# Altium integrated library Diode-SMD_V2.IntLib: 415 symbols (part 2 of 2)
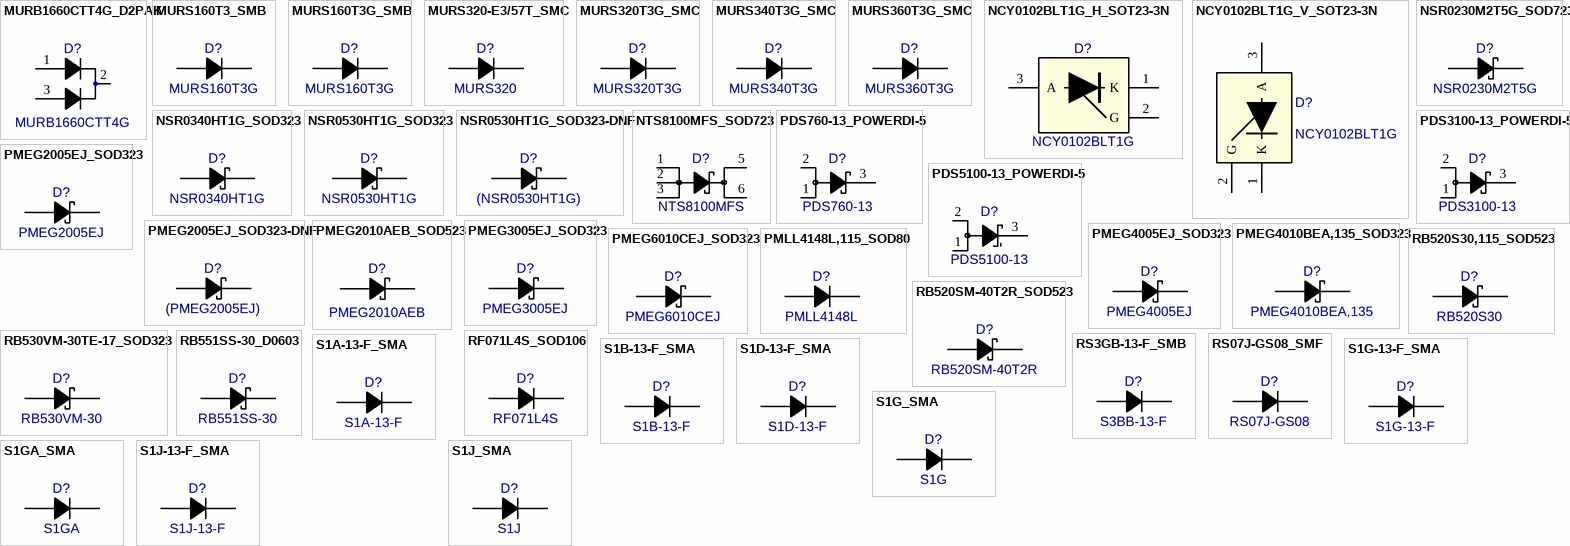
[diagram p11: symbols MURB1660CTT4G_D2PAK to S1J_SMA]

## NSR0530HT1G_SOD323
designator D?, comment NSR0530HT1G
Diode Schottky Barrier (30Volt 0.5A); Manufacturer: On Semi; Package: SOD323; EDM-PN: *; Text2: *; Text1: *; Part Number: NSR0530HT1G; SAAB PN: *; Value: NSR0530HT1G; DCE Part No: *
footprint SOD323 (Diode, SOD323 2-Leads, Body 1.7x1.25mm, IPC Medium Density)
pins: 1 C, 2 A

## NSR0530HT1G_SOD323-DNF
designator D?, comment value (NSR0530HT1G)  (hidden comment: NSR0530HT1G)
Diode Schottky Barrier (30Volt 0.5A) - Do not Fit; Manufacturer: On Semi; Part Number: DNF - NSR0530HT1G; Package: SOD323; EDM-PN: *; Text2: *; Text1: *; SAAB PN: *; DCE Part No: *
footprint SOD323 (Diode, SOD323 2-Leads, Body 1.7x1.25mm, IPC Medium Density)
pins: 1 C, 2 A

## NTS8100MFS_SOD723
designator D?, comment NTS8100MFS
Diode Schottky 100Volt 8A; Manufacturer: On Semi; Package: SO8-FL-5.8x4.9; EDM-PN: *; Text2: *; Text1: *; Part Number: NTS8100MFS; SAAB PN: *; Value: NTS8100MFS; DCE Part No: *
footprint SO8-FL-5.8x4.9 (SO 8 FL 5.8x4.9mm)
pins: 1 A, 2 A, 3 A, 5 C, 6 C

## PDS760-13_POWERDI-5
designator D?, comment PDS760-13
Diode Schottky 60Volt 7A; Manufacturer: Diodes; Package: POWERDI-5; EDM-PN: *; Text2: *; Text1: *; Value: PDS760-13; SAAB PN: *; Part Number: PDS760-13; DCE Part No: *
footprint POWERDI-5 (POWERDI-5 4.0x5.45mm)
pins: 1 A, 2 A, 3 C

## PDS3100-13_POWERDI-5
designator D?, comment PDS3100-13
Diode Schottky 100Volt 3A; Manufacturer: Diodes; Package: POWERDI-5; EDM-PN: *; Text2: *; Text1: *; Value: PDS3100-13; SAAB PN: *; Part Number: PDS3100-13; DCE Part No: *
footprint POWERDI-5 (POWERDI-5 4.0x5.45mm)
pins: 1 A, 2 A, 3 C

## PDS5100-13_POWERDI-5
designator D?, comment PDS5100-13
Diode Schottky 100Volt 5A; Manufacturer: Diodes; Package: POWERDI-5; EDM-PN: *; Text2: *; Text1: *; Value: PDS5100-13; SAAB PN: *; Part Number: PDS5100-13; DCE Part No: *
footprint POWERDI-5 (POWERDI-5 4.0x5.45mm)
pins: 1 A, 2 A, 3 C

## PMEG2005EJ_SOD323
designator D?, comment PMEG2005EJ
Diode Schottky 20Volt 0.5A; Manufacturer: NXP/Digikey; Part Number: PMEG2005EJ/568-4110-1; Package: SOD323; EDM-PN: *; Text2: *; Text1: *; SAAB PN: *; Value: PMEG2005EJ; DCE Part No: *
footprint SOD323 (Diode, SOD323 2-Leads, Body 1.7x1.25mm, IPC Medium Density)
pins: 1 C, 2 A

## PMEG2005EJ_SOD323-DNF
designator D?, comment value (PMEG2005EJ)  (hidden comment: PMEG2005EJ-DNF)
Diode Schottky 20Volt 0.5A Do not Fit; Manufacturer: NXP/Digikey; Part Number: DNF - PMEG2005EJ/568-4110-1; Package: SOD323; EDM-PN: *; Text2: *; Text1: *; SAAB PN: *; DCE Part No: *
footprint SOD323 (Diode, SOD323 2-Leads, Body 1.7x1.25mm, IPC Medium Density)
pins: 1 C, 2 A

## PMEG2010AEB_SOD523
designator D?, comment PMEG2010AEB
Diode Schottky 20V 1A; Manufacturer: Nexperia; Package: SOD523; EDM-PN: *; Text2: *; Text1: *; Value: PMEG2010AEB; SAAB PN: *; Part Number: PMEG2010AEB; DCE Part No: *
footprint SOD523 (SOD523 1.25x0.85mm)
pins: 1 C, 2 A

## PMEG3005EJ_SOD323
designator D?, comment PMEG3005EJ
Diode Schottky 30Volt 0.5A; Manufacturer: NXP; Package: SOD323; EDM-PN: *; Text2: *; Text1: *; Value: PMEG3005EJ; SAAB PN: *; Part Number: PMEG3005EJ; DCE Part No: *
footprint SOD323 (Diode, SOD323 2-Leads, Body 1.7x1.25mm, IPC Medium Density)
pins: 1 C, 2 A

## PMEG4005EJ_SOD323
designator D?, comment PMEG4005EJ
Diode Schottky 40Volt 0.5A; Manufacturer: NXP; Package: SOD323; EDM-PN: *; Text2: *; Text1: *; Value: PMEG4005EJ; SAAB PN: *; Part Number: PMEG4005EJ; DCE Part No: *
footprint SOD323 (Diode, SOD323 2-Leads, Body 1.7x1.25mm, IPC Medium Density)
pins: 1 C, 2 A

## PMEG4010BEA,135_SOD323
designator D?, comment PMEG4010BEA,135
Diode Schottky 40Volt 1A; Manufacturer: Nexperia; Package: SOD323; EDM-PN: *; Text2: *; Text1: *; Value: PMEG4010BEA,135; SAAB PN: *; Part Number: PMEG4010BEA,135; DCE Part No: *
footprint SOD323 (Diode, SOD323 2-Leads, Body 1.7x1.25mm, IPC Medium Density)
pins: 1 C, 2 A

## PMEG6010CEJ_SOD323
designator D?, comment PMEG6010CEJ
Diode Schottky 60Volt 1A; Manufacturer: NXP; Package: SOD323; EDM-PN: *; Text2: *; Text1: *; Value: PMEG6010CEJ; SAAB PN: *; Part Number: PMEG6010CEJ; DCE Part No: *
footprint SOD323 (Diode, SOD323 2-Leads, Body 1.7x1.25mm, IPC Medium Density)
pins: 1 C, 2 A

## PMLL4148L,115_SOD80
designator D?, comment value PMLL4148L  (hidden comment: PMLL4148L,115)
Diode Fast Switching Surface Mount; Manufacturer: Nexperia; Package: SOD80; EDM-PN: *; Text2: *; Text1: *; SAAB PN: *; Part Number: PMLL4148L,115; DCE Part No: *
footprint SOD80 (Diode, SOD80 2-Leads, Body 3.5x1.4mm, IPC Medium Density)
pins: 1 C, 2 A

## RB520S30,115_SOD523
designator D?, comment value RB520S30  (hidden comment: RB520S30,115)
Diode Schottky 30V 200mA; Manufacturer: Nexperia; Package: SOD523; EDM-PN: *; Text2: *; Text1: *; SAAB PN: *; Part Number: RB520S30,115; DCE Part No: *
footprint SOD523 (SOD523 1.25x0.85mm)
pins: 1 C, 2 A

## RB520SM-40T2R_SOD523
designator D?, comment RB520SM-40T2R
Diode Schottky 40V 200mA; Manufacturer: Rohm; Package: SOD523; EDM-PN: *; Text2: *; Text1: *; Value: RB520SM-40T2R; SAAB PN: *; Part Number: RB520SM-40T2R; DCE Part No: *
footprint SOD523 (SOD523 1.25x0.85mm)
pins: 1 C, 2 A

## RB530VM-30TE-17_SOD323
designator D?, comment value RB530VM-30  (hidden comment: RB530VM-30TE-17)
Diode Schottky (30Volt 100mA); Manufacturer: Rohm; Package: SOD323; EDM-PN: *; Text2: *; Text1: *; SAAB PN: *; Part Number: RB530VM-30TE-17; DCE Part No: *
footprint SOD323 (Diode, SOD323 2-Leads, Body 1.7x1.25mm, IPC Medium Density)
pins: 1 C, 2 A

## RB551SS-30_D0603
designator D?, comment RB551SS-30
Diode Schottky (20Volt 0.5A); Manufacturer: Rohm; Package: D0603-KMD2; EDM-PN: *; Text2: *; Text1: *; Value: RB551SS-30; SAAB PN: *; Part Number: RB551SS-30; DCE Part No: *
footprint D0603-KMD2 (KMD2 1.6x0.8mm)
pins: 1 C, 2 A

## RF071L4S_SOD106
designator D?, comment RF071L4S
Diode Super fast Recovery 0.7Amp 400V; Manufacturer: Rohm; Package: SOD106; EDM-PN: *; Text2: *; Text1: *; Value: RF071L4S; SAAB PN: *; Part Number: RF071L4S; DCE Part No: *
footprint SOD106 (SOD 106 4.5x2.6mm)
pins: 1 C, 2 A

## RS3GB-13-F_SMB
designator D?, comment Part Number: S3BB-13-F  (hidden comment: RS3GB-13-F)
Diode Rectifier 400V 3Amp; Manufacturer: Diodes; Package: SMB; EDM-PN: *; Text2: *; Text1: *; Value: RS3GB-13-F; Reutech PN: *; SAAB PN: *; DCE Part No: *
footprint SMB (SMB 4.75x3.94mm)
pins: 1 C, 2 A

## RS07J-GS08_SMF
designator D?, comment RS07J-GS08
Diode Rectifier 600V 500mA; Manufacturer: Vishay; Package: SMF; EDM-PN: *; Text2: *; Text1: *; Value: RS07J-GS08; SAAB PN: *; Part Number: RS07J-GS08; DCE Part No: *
footprint SMF (SMF 2.8x1.8mm)
pins: 1 C, 2 A

## S1A-13-F_SMA
designator D?, comment S1A-13-F
Diode 1Amp 50V; Manufacturer: Diodes; Package: SMA; EDM-PN: *; Text2: *; Text1: *; Value: S1A-13-F; SAAB PN: *; DCE Part No: *; Part Number: S1A-13-F
footprint SMA (SMA 5.6x2.95mm)
pins: 1 C, 2 A

## S1B-13-F_SMA
designator D?, comment S1B-13-F
Diode 1Amp 100V; Manufacturer: Diodes; Package: SMA; EDM-PN: *; Text2: *; Text1: *; Value: S1B-13-F; SAAB PN: *; Part Number: S1B-13-F; DCE Part No: *
footprint SMA (SMA 5.6x2.95mm)
pins: 1 C, 2 A

## S1D-13-F_SMA
designator D?, comment S1D-13-F
Diode 1Amp 200V; Manufacturer: Diodes; Package: SMA; EDM-PN: *; Text2: *; Text1: *; Value: S1D-13-F; SAAB PN: *; Part Number: S1D-13-F; DCE Part No: *
footprint SMA (SMA 5.6x2.95mm)
pins: 1 C, 2 A

## S1G-13-F_SMA
designator D?, comment S1G-13-F
Diode 1Amp 400V; Manufacturer: Diodes; Package: SMA; EDM-PN: *; Text2: *; Text1: *; Value: S1G-13-F; SAAB PN: *; Part Number: S1G-13-F; DCE Part No: *
footprint SMA (SMA 5.6x2.95mm)
pins: 1 C, 2 A

## S1G_SMA
designator D?  Part Number: S1G  (hidden comment: S1G_SMA)
Diode Rectifier 1Amp 400V; Manufacturer: Variuos; EDM-PN: DIO10; Package: SMA; Text2: *; Text1: *; Value: S1G_SMA; SAAB PN: *; DCE Part No: *
footprint SMA (SMA 5.6x2.95mm)
pins: 1 C, 2 A

## S1GA_SMA
designator D?  Part Number: S1GA  (hidden comment: S1GA_SMA)
Diode Rectifier 1Amp 400V; Manufacturer: Vishay; Value: S1GA; Package: SMA; EDM-PN: *; Text2: *; Text1: *; SAAB PN: *; DCE Part No: *
footprint SMA (SMA 5.6x2.95mm)
pins: 1 C, 2 A

## S1J-13-F_SMA
designator D?, comment S1J-13-F
Diode 1Amp 600V; Manufacturer: Diodes; Package: SMA; EDM-PN: *; Text2: *; Text1: *; Value: S1J-13-F; SAAB PN: *; Part Number: S1J-13-F; DCE Part No: *
footprint SMA (SMA 5.6x2.95mm)
pins: 1 C, 2 A

## S1J_SMA
designator D?  Part Number: S1J  (hidden comment: S1J_SMA)
Diode Rectifier 1Amp 600V; Manufacturer: Diotec; EDM-PN: DIO103; Package: SMA; Text2: *; Text1: *; Value: S1J_SMA; SAAB PN: *; DCE Part No: *
footprint SMA (SMA 5.6x2.95mm)
pins: 1 C, 2 A

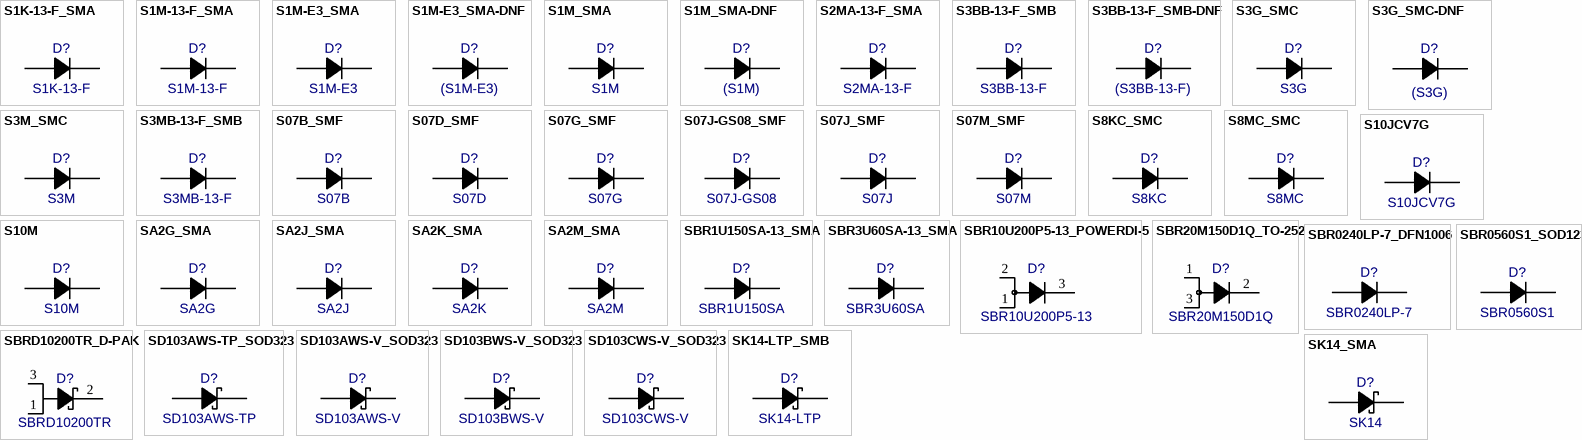
[diagram p7: symbols S1K-13-F_SMA to SK14_SMA]

## S1K-13-F_SMA
designator D?, comment Part Number: S1K-13-F  (hidden comment: S1J-13-F)
Diode 1Amp 800V; Manufacturer: Diodes; Value: S1K-13-F; Package: SMA; EDM-PN: *; Text2: *; Text1: *; SAAB PN: *; DCE Part No: *
footprint SMA (SMA 5.6x2.95mm)
pins: 1 C, 2 A

## S1M-13-F_SMA
designator D?, comment S1M-13-F
Diode 1Amp 1000V; Manufacturer: Diodes; Package: SMA; EDM-PN: *; Text2: *; Text1: *; Value: S1M-13-F; SAAB PN: *; Part Number: S1M-13-F; DCE Part No: *
footprint SMA (SMA 5.6x2.95mm)
pins: 1 C, 2 A

## S1M-E3_SMA
designator D?  Part Number: S1M-E3  (hidden comment: S1M-E3_SMA)
Diode Rectifier 1Amp 1000V; Manufacturer: Diotec; Value: S1M-E3; Package: SMA; EDM-PN: *; Text2: *; Text1: *; SAAB PN: *; DCE Part No: *
footprint SMA (SMA 5.6x2.95mm)
pins: 1 C, 2 A

## S1M-E3_SMA-DNF
designator D?, comment value (S1M-E3)  (hidden comment: S1M-E3_SMA)
Diode Rectifier 1Amp 1000V - Do not Fit; Manufacturer: Diotec; Part Number: DNF - S1M-E3; Package: SMA; EDM-PN: *; Text2: *; Text1: *; SAAB PN: *; DCE Part No: *
footprint SMA (SMA 5.6x2.95mm)
pins: 1 C, 2 A

## S1M_SMA
designator D?  Part Number: S1M  (hidden comment: S1M_SMA)
Diode Rectifier 1Amp 1000V; Manufacturer: Diotec; Value: S1M; Package: SMA; EDM-PN: *; Text2: *; Text1: *; SAAB PN: *; DCE Part No: *
footprint SMA (SMA 5.6x2.95mm)
pins: 1 C, 2 A

## S1M_SMA-DNF
designator D?, comment value (S1M)  (hidden comment: S1M_SMA)
Diode Rectifier 1Amp 1000V - Do not Fit; Manufacturer: Diotec; Part Number: DNF - S1M; Package: SMA; EDM-PN: *; Text2: *; Text1: *; SAAB PN: *; DCE Part No: *
footprint SMA (SMA 5.6x2.95mm)
pins: 1 C, 2 A

## S2MA-13-F_SMA
designator D?, comment S2MA-13-F
Diode Rectifier 1.5Amp 1000V; Manufacturer: Diodes; Package: SMA; EDM-PN: *; Text2: *; Text1: *; Value: S2MA-13-F; SAAB PN: *; Part Number: S2MA-13-F; DCE Part No: *
footprint SMA (SMA 5.6x2.95mm)
pins: 1 C, 2 A

## S3BB-13-F_SMB
designator D?, comment S3BB-13-F
Diode Rectifier 3Amp 100V; Manufacturer: Diodes; Reutech PN: 5961-RE-; Package: SMB; EDM-PN: *; Text2: *; Text1: *; Value: S3BB-13-F; SAAB PN: *; Part Number: S3BB-13-F; DCE Part No: *
footprint SMB (SMB 4.75x3.94mm)
pins: 1 C, 2 A

## S3BB-13-F_SMB-DNF
designator D?, comment value (S3BB-13-F)  (hidden comment: S3BB-13-F)
Diode Rectifier 3Amp 100V - Do not Fit; Manufacturer: Diodes; Part Number: DNF - S3BB-13-F; Reutech PN: 5961-RE-; Package: SMB; EDM-PN: *; Text2: *; Text1: *; SAAB PN: *; DCE Part No: *
footprint SMB (SMB 4.75x3.94mm)
pins: 1 C, 2 A

## S3G_SMC
designator D?, comment S3G
Diode Rectifier 3Amp 400V; Manufacturer: On Semi; Package: SMC; EDM-PN: *; Text2: *; Text1: *; Value: S3G; SAAB PN: *; Part Number: S3G; DCE Part No: *
footprint SMC (Molded Diode, 2-Leads, Body 6.9x5.8mm, IPC Medium Density)
pins: 1 C, 2 A

## S3G_SMC-DNF
designator D?, comment value (S3G)  (hidden comment: S3G)
Diode Rectifier 3Amp 400V - Do not Fit; Manufacturer: On Semi; Part Number: DNF - S3G; Package: SMC; EDM-PN: *; Text2: *; Text1: *; SAAB PN: *; DCE Part No: *
footprint SMC (Molded Diode, 2-Leads, Body 6.9x5.8mm, IPC Medium Density)
pins: 1 C, 2 A

## S3M_SMC
designator D?, comment S3M
Diode Rectifier 3Amp 1000V; Manufacturer: On Semi; Package: SMC; EDM-PN: *; Text2: *; Text1: *; Value: S3M; SAAB PN: *; Part Number: S3M; DCE Part No: *
footprint SMC (Molded Diode, 2-Leads, Body 6.9x5.8mm, IPC Medium Density)
pins: 1 C, 2 A

## S3MB-13-F_SMB
designator D?, comment S3MB-13-F
Diode Rectifier 3Amp 1000V; Manufacturer: Diodes; Value: S3MB-13-F_SMB; Reutech PN: 5961-RE-0072; Package: SMB; EDM-PN: *; Text2: *; Text1: *; SAAB PN: *; Part Number: S3MB-13-F; DCE Part No: *
footprint SMB (SMB 4.75x3.94mm)
pins: 1 C, 2 A

## S07B_SMF
designator D?  Part Number: S07B  (hidden comment: S07B_SMF)
Diode Rectifier 700mA 100V; Manufacturer: Vishay; Package: SMF; EDM-PN: *; Text2: *; Text1: *; Value: S07B_SMF; SAAB PN: *; DCE Part No: *
footprint SMF (SMF 2.8x1.8mm)
pins: 1 C, 2 A

## S07D_SMF
designator D?  Part Number: S07D  (hidden comment: S07D_SMF)
Diode Rectifier 700mA 200V; Manufacturer: Vishay; Package: SMF; EDM-PN: *; Text2: *; Text1: *; Value: S07D_SMF; SAAB PN: *; DCE Part No: *
footprint SMF (SMF 2.8x1.8mm)
pins: 1 C, 2 A

## S07G_SMF
designator D?  Part Number: S07G  (hidden comment: S07G_SMF)
Diode Rectifier 700mA 400V; Manufacturer: Vishay; Package: SMF; EDM-PN: *; Text2: *; Text1: *; Value: S07G_SMF; SAAB PN: *; DCE Part No: *
footprint SMF (SMF 2.8x1.8mm)
pins: 1 C, 2 A

## S07J-GS08_SMF
designator D?, comment S07J-GS08
Diode Rectifier 1.5A 600V; Manufacturer: Vishay; Package: SMF; EDM-PN: *; Text2: *; Text1: *; Value: S07J-GS08; SAAB PN: *; Part Number: S07J-GS08; DCE Part No: *
footprint SMF (SMF 2.8x1.8mm)
pins: 1 C, 2 A

## S07J_SMF
designator D?  Part Number: S07J  (hidden comment: S07J_SMF)
Diode Rectifier 700mA 600V; Manufacturer: Vishay; Package: SMF; EDM-PN: *; Text2: *; Text1: *; Value: S07J_SMF; SAAB PN: *; DCE Part No: *
footprint SMF (SMF 2.8x1.8mm)
pins: 1 C, 2 A

## S07M_SMF
designator D?  Part Number: S07M  (hidden comment: S07M_SMF)
Diode Rectifier 700mA 1000V; Manufacturer: Vishay; Package: SMF; EDM-PN: *; Text2: *; Text1: *; Value: S07M_SMF; SAAB PN: *; DCE Part No: *
footprint SMF (SMF 2.8x1.8mm)
pins: 1 C, 2 A

## S8KC_SMC
designator D?, comment S8KC
Diode Rectifier 8Amp 800V; Manufacturer: Diodes; Value: S8KC_SMC; Package: SMC; EDM-PN: *; Text2: *; Text1: *; SAAB PN: *; Part Number: S8KC; DCE Part No: *
footprint SMC (Molded Diode, 2-Leads, Body 6.9x5.8mm, IPC Medium Density)
pins: 1 C, 2 A

## S8MC_SMC
designator D?, comment S8MC
Diode Rectifier 8Amp 1000V; Manufacturer: Diodes; Value: S8MC_SMC; Package: SMC; EDM-PN: *; Text2: *; Text1: *; SAAB PN: *; Part Number: S8MC; DCE Part No: *
footprint SMC (Molded Diode, 2-Leads, Body 6.9x5.8mm, IPC Medium Density)
pins: 1 C, 2 A

## S10JCV7G
designator D?
Diode Rectifier 10Amp 600V; Manufacturer: TSC; Package: DO-214AB; EDM-PN: *; Text2: *; Text1: *; Value: S10JCV7G; SAAB PN: *; Part Number: S10JCV7G; DCE Part No: *
footprint DO-214AB (Molded Diode, 2-Leads, Body 6.9x5.8mm, IPC Medium Density)
pins: 1 C, 2 A

## S10M
designator D?
Diode Rectifier 10Amp 1000V; Manufacturer: MCC; Package: DO-214AB; EDM-PN: *; Text2: *; Text1: *; Value: S10M; SAAB PN: *; Part Number: S10M; DCE Part No: *
footprint DO-214AB (Molded Diode, 2-Leads, Body 6.9x5.8mm, IPC Medium Density)
pins: 1 C, 2 A

## SA2G_SMA
designator D?  Part Number: SA2G  (hidden comment: SA2G_SMA)
Diode Rectifier 2Amp 400V; Manufacturer: Vishay; Value: SA2G; Package: SMA; EDM-PN: *; Text2: *; Text1: *; SAAB PN: *; DCE Part No: *
footprint SMA (SMA 5.6x2.95mm)
pins: 1 C, 2 A

## SA2J_SMA
designator D?  Part Number: SA2J  (hidden comment: SA2J_SMA)
Diode Rectifier 2Amp 600V; Manufacturer: Vishay; Value: SA2J; Package: SMA; EDM-PN: *; Text2: *; Text1: *; SAAB PN: *; DCE Part No: *
footprint SMA (SMA 5.6x2.95mm)
pins: 1 C, 2 A

## SA2K_SMA
designator D?  Part Number: SA2K  (hidden comment: SA2K_SMA)
Diode Rectifier 2Amp 800V; Manufacturer: Vishay; Value: SA2K; Package: SMA; EDM-PN: *; Text2: *; Text1: *; SAAB PN: *; DCE Part No: *
footprint SMA (SMA 5.6x2.95mm)
pins: 1 C, 2 A

## SA2M_SMA
designator D?  Part Number: SA2M  (hidden comment: SA2M_SMA)
Diode Rectifier 2Amp 1000V; Manufacturer: Vishay; Value: SA2M; Package: SMA; EDM-PN: *; Text2: *; Text1: *; SAAB PN: *; DCE Part No: *
footprint SMA (SMA 5.6x2.95mm)
pins: 1 C, 2 A

## SBR1U150SA-13_SMA
designator D?, comment value SBR1U150SA  (hidden comment: SBR1U150SA-13)
Diode Super Barrier 150V 1A; Manufacturer: Diodes; Package: SMA; EDM-PN: *; Text2: *; Text1: *; SAAB PN: *; Part Number: SBR1U150SA-13; DCE Part No: *
footprint SMA (SMA 5.6x2.95mm)
pins: 1 C, 2 A

## SBR3U60SA-13_SMA
designator D?, comment value SBR3U60SA  (hidden comment: SBR3U60SA-13)
Diode Super Barrier 60V 3A; Manufacturer: Diodes; Package: SMA; EDM-PN: *; Text2: *; Text1: *; SAAB PN: *; Part Number: SBR3U60SA-13; DCE Part No: *
footprint SMA (SMA 5.6x2.95mm)
pins: 1 C, 2 A

## SBR10U200P5-13_POWERDI-5
designator D?, comment SBR10U200P5-13
Diode Super Barrier 200V 10A; Manufacturer: Diodes; Package: POWERDI-5; EDM-PN: *; Text2: *; Text1: *; Value: SBR10U200P5-13; SAAB PN: *; Part Number: SBR10U200P5-13; DCE Part No: *
footprint POWERDI-5 (POWERDI-5 4.0x5.45mm)
pins: 1 A, 2 A, 3 C

## SBR20M150D1Q_TO-252
designator D?, comment SBR20M150D1Q
Diode Super Barrier 150V 20A; Manufacturer: Diodes; Package: TO-252; EDM-PN: *; Text2: *; Text1: *; Value: SBR20M150D1Q; SAAB PN: *; Part Number: SBR20M150D1Q; DCE Part No: *
footprint TO-252 (TO-252 6.58x6.1mm)
pins: 1 A, 2 C, 3 A

## SBR0240LP-7_DFN1006
designator D?, comment SBR0240LP-7
Diode Super Barrier Rectifier (40V 250mA); Manufacturer: Diodes; DCE Part No: 9476; Package: DFN1006-2; EDM-PN: *; Text2: *; Text1: *; Value: SBR0240LP-7; SAAB PN: *; Part Number: SBR0240LP-7
footprint DFN1006-2 (DFN1006-2 1.0x0.6mm)
pins: 1 C, 2 A

## SBR0560S1_SOD123
designator D?, comment SBR0560S1
Diode Super Barrier Rectifier 0.5A 60V; Manufacturer: Diodes; Package: SOD123; EDM-PN: *; Text2: *; Text1: *; Value: SBR0560S1; SAAB PN: *; Part Number: SBR0560S1; DCE Part No: *
footprint SOD123 (SOD 123 2.85x1.7mm)
pins: 1 C, 2 A

## SBRD10200TR_D-PAK
designator D?, comment SBRD10200TR
Diode Schottky 10Amp 200V; Manufacturer: SMC; Package: D-PAK; EDM-PN: *; Text2: *; Text1: *; Value: SBRD10200TR; SAAB PN: *; Part Number: SBRD10200TR; DCE Part No: *
footprint D-PAK (D-Pak 6.73x6.22mm)
pins: 1 A, 2 C, 3 A

## SD103AWS-TP_SOD323
designator D?, comment SD103AWS-TP
Diode Schottky 40Volt 350mA; Manufacturer: MCC; Package: SOD323; EDM-PN: *; Text2: *; Text1: *; Value: SD103AWS-TP; SAAB PN: *; DCE Part No: *; Part Number: SD103AWS-TP
footprint SOD323 (Diode, SOD323 2-Leads, Body 1.7x1.25mm, IPC Medium Density)
pins: 1 C, 2 A

## SD103AWS-V_SOD323
designator D?, comment SD103AWS-V
Diode Schottky 40Volt 350mA; Manufacturer: Various; EDM-PN: DIO294; Package: SOD323; Text2: *; Text1: *; Value: SD103AWS-V; SAAB PN: *; DCE Part No: *; Part Number: SD103AWS-V
footprint SOD323 (Diode, SOD323 2-Leads, Body 1.7x1.25mm, IPC Medium Density)
pins: 1 C, 2 A

## SD103BWS-V_SOD323
designator D?, comment SD103BWS-V
Diode Schottky (30Volt 200mA); Manufacturer: Vishay; Package: SOD323; EDM-PN: *; Text2: *; Text1: *; Value: SD103BWS-V; SAAB PN: *; Part Number: SD103BWS-V; DCE Part No: *
footprint SOD323 (Diode, SOD323 2-Leads, Body 1.7x1.25mm, IPC Medium Density)
pins: 1 C, 2 A

## SD103CWS-V_SOD323
designator D?, comment SD103CWS-V
Diode Schottky (20Volt 200mA); Manufacturer: Vishay; Package: SOD323; EDM-PN: *; Text2: *; Text1: *; Value: SD103CWS-V; SAAB PN: *; Part Number: SD103CWS-V; DCE Part No: *
footprint SOD323 (Diode, SOD323 2-Leads, Body 1.7x1.25mm, IPC Medium Density)
pins: 1 C, 2 A

## SK14-LTP_SMB
designator D?  Part Number: SK14-LTP  (hidden comment: SK14-LTP_SMB)
Diode Schottky Rectifier 1Amp 40V; Manufacturer: MCC; Package: SMB; EDM-PN: *; Text2: *; Text1: *; Value: SK14-LTP; SAAB PN: *; DCE Part No: *
footprint SMB (SMB 4.75x3.94mm)
pins: 1 C, 2 A

## SK14_SMA
designator D?  Part Number: SK14  (hidden comment: SK14_SMA)
Diode Schottky Rectifier 1Amp 40V; Manufacturer: Diotec; Value: SK14; Package: SMA; EDM-PN: *; Text2: *; Text1: *; SAAB PN: *; DCE Part No: *
footprint SMA (SMA 5.6x2.95mm)
pins: 1 C, 2 A

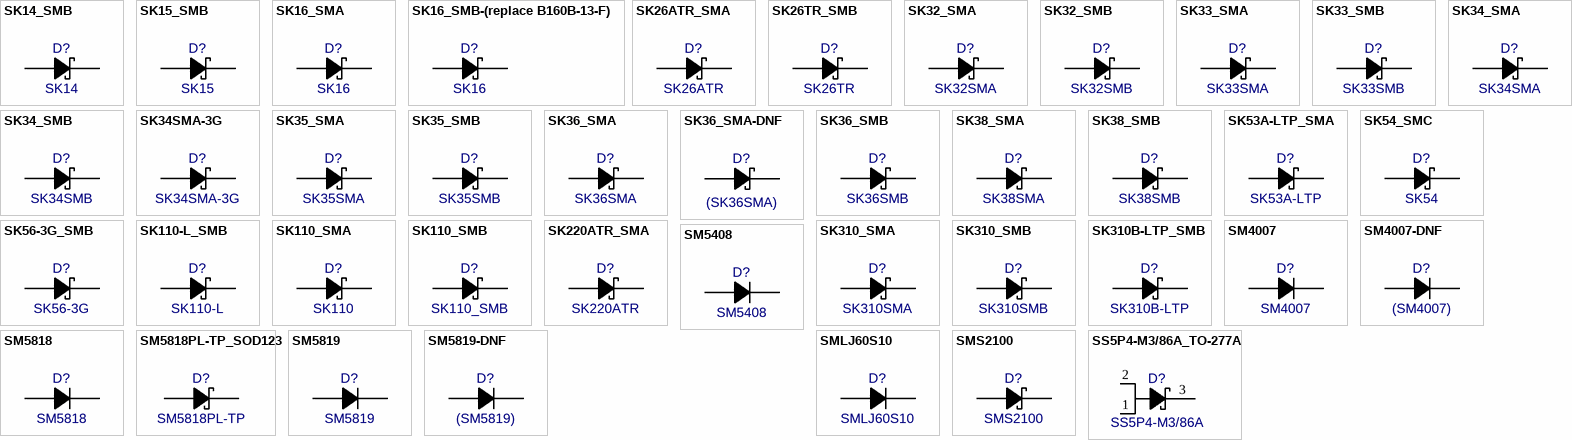
[diagram p8: symbols SK14_SMB to SS5P4-M3/86A_TO-277A]

## SK14_SMB
designator D?  Part Number: SK14  (hidden comment: SK14_SMB)
Diode Schottky Rectifier 1Amp 40V; Manufacturer: Diodes; Value: SK14; Package: SMB; EDM-PN: *; Text2: *; Text1: *; SAAB PN: *; DCE Part No: *
footprint SMB (SMB 4.75x3.94mm)
pins: 1 C, 2 A

## SK15_SMB
designator D?  Part Number: SK15  (hidden comment: SK15_SMB)
Diode Schottky Rectifier 1Amp 50V; Manufacturer: Diodes; Value: SK15; Package: SMB; EDM-PN: *; Text2: *; Text1: *; SAAB PN: *; DCE Part No: *
footprint SMB (SMB 4.75x3.94mm)
pins: 1 C, 2 A

## SK16_SMA
designator D?  Part Number: SK16  (hidden comment: SK16_SMA)
Diode Schottky Rectifier 1Amp 60V; Manufacturer: Diotec; EDM-PN: DIO104; Package: SMA; Text2: *; Text1: *; Value: SK16_SMA; SAAB PN: *; DCE Part No: *
footprint SMA (SMA 5.6x2.95mm)
pins: 1 C, 2 A

## SK16_SMB-(replace B160B-13-F)
designator D?, comment Part Number: SK16  (hidden comment: SK16_SMB)
Diode Schottky Rectifier 1Amp 60V; Manufacturer: Diodes; Value: SK16; Package: SMB; EDM-PN: *; Text2: *; Text1: *; SAAB PN: *; DCE Part No: *
footprint SMB (SMB 4.75x3.94mm)
pins: 1 C, 2 A

## SK26ATR_SMA
designator D?, comment SK26ATR
Diode Schottky Rectifier 2Amp 60V; Manufacturer: SMC Diode Solutions; Package: SMA; EDM-PN: *; Text2: *; Text1: *; Value: SK26ATR; SAAB PN: *; Part Number: SK26ATR; DCE Part No: *
footprint SMA (SMA 5.6x2.95mm)
pins: 1 C, 2 A

## SK26TR_SMB
designator D?, comment SK26TR
Diode Schottky Rectifier 2Amp 60V; Manufacturer: SMC Diode Solutions; Package: SMB; EDM-PN: *; Text2: *; Text1: *; Value: SK26TR; SAAB PN: *; Part Number: SK26TR; DCE Part No: *
footprint SMB (SMB 4.75x3.94mm)
pins: 1 C, 2 A

## SK32_SMA
designator D?  Part Number: SK32SMA  (hidden comment: SK32_SMA)
Diode Schottky Rectifier 3Amp 20V; Manufacturer: Diotec; Value: SK32SMA; Package: SMA; EDM-PN: *; Text2: *; Text1: *; SAAB PN: *; DCE Part No: *
footprint SMA (SMA 5.6x2.95mm)
pins: 1 C, 2 A

## SK32_SMB
designator D?  Part Number: SK32SMB  (hidden comment: SK32_SMB)
Diode Schottky Rectifier 3Amp 20V; Manufacturer: Diotec; Value: SK32SMB; Package: SMB; EDM-PN: *; Text2: *; Text1: *; SAAB PN: *; DCE Part No: *
footprint SMB (SMB 4.75x3.94mm)
pins: 1 C, 2 A
